# Altium footprint library PcbLib_jp.PcbLib: 178 footprints (part 8 of 12)
Each footprint in its own frame and in the unit in brackets; x right, y up, seen from the top. Pads: shape width x height; smd on the part's side, far side on the other; paste and mask are expansions set on the pad; w line width, h text height; cw(c..) or ccw(c..) is an arc to the next point about the centre after c.
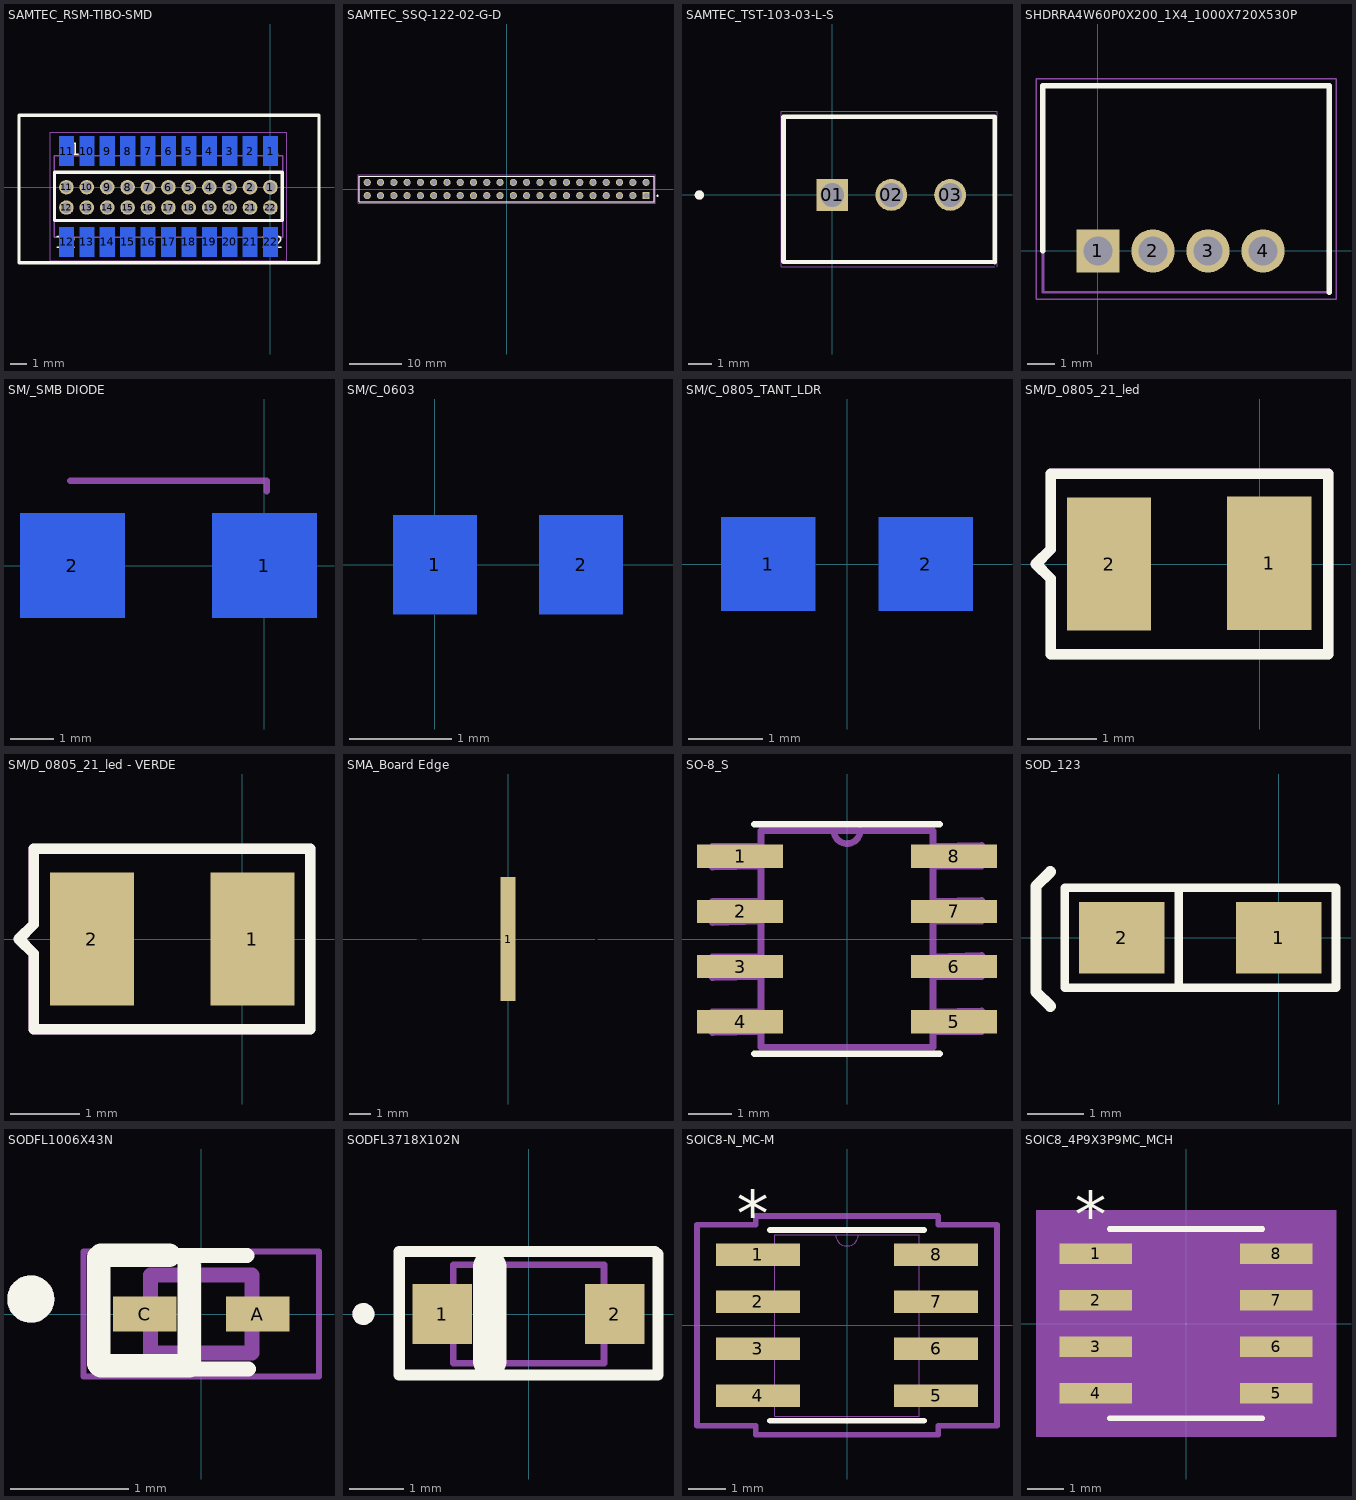
[diagram p7: the footprints below, top view; thin cyan lines are the x and y axes]

## SAMTEC_RSM-TIBO-SMD [mm]
pads (44):
  oval 0.914x0.889 hole 0.65: 1(0,0) 2(-1.27,0) 3(-2.54,0) 4(-3.81,0) 5(-5.08,0) 6(-6.35,0) 7(-7.62,0) 8(-8.89,0) 9(-10.16,0) 10(-11.43,0) 11(-12.7,0) 12(-12.7,-1.27) 13(-11.43,-1.27) 14(-10.16,-1.27) 15(-8.89,-1.27) 16(-7.62,-1.27) 17(-6.35,-1.27) 18(-5.08,-1.27) 19(-3.81,-1.27) 20(-2.54,-1.27) 21(-1.27,-1.27) 22(0,-1.27)
  rect 0.91x1.84 smd far side: 1(0.007,2.242) 2(-1.263,2.242) 3(-2.533,2.242) 4(-3.803,2.242) 5(-5.073,2.242) 6(-6.343,2.242) 7(-7.613,2.242) 8(-8.883,2.242) 9(-10.153,2.242) 10(-11.423,2.242) 11(-12.693,2.242) 12(-12.693,-3.408) 13(-11.423,-3.408) 14(-10.153,-3.408) 15(-8.883,-3.408) 16(-7.613,-3.408) 17(-6.343,-3.408) 18(-5.073,-3.408) 19(-3.803,-3.408) 20(-2.533,-3.408) 21(-1.263,-3.408) 22(0.007,-3.408)
Top Overlay:
  lines w0.2: -15.65,-4.7 3.025,-4.7 3.025,4.475 -15.65,4.475 -15.65,-4.475 -15.65,-4.7 ; -13.443,-2.075 -13.443,0.925 -13.155,0.925 0.732,0.925 0.732,-2.075 -13.106,-2.075 -13.443,-2.075
  text "1" at -0.075,1.975 h0.76
  text "11" at -13.175,1.975 h0.76
  text "12" at -13.425,-3.8 h0.76
  text "22" at -0.525,-3.8 h0.76
Mechanical 13:
  lines w0.1: -13.453,-3.123 0.767,-3.123 0.767,1.957 -13.453,1.957 -13.453,-3.123
Mechanical 15:
  lines w0.05: -13.703,-4.578 1.017,-4.578 1.017,3.412 -13.703,3.412 -13.703,-4.578
3D body "Tibbo Technology Inc-EM500.STEP": height 16.1, standoff -2.75, extent -15.45,-2.25 2.75,4.15

## SAMTEC_SSQ-122-02-G-D [mm]
pads (44):
  rect 1.37x1.37 hole 1.02: 01(26.67,-1.27)
  round 1.37 hole 1.02: 02(26.67,1.27) 03(24.13,-1.27) 04(24.13,1.27) 05(21.59,-1.27) 06(21.59,1.27) 07(19.05,-1.27) 08(19.05,1.27) 09(16.51,-1.27) 10(16.51,1.27) 11(13.97,-1.27) 12(13.97,1.27) 13(11.43,-1.27) 14(11.43,1.27) 15(8.89,-1.27) 16(8.89,1.27) 17(6.35,-1.27) 18(6.35,1.27) 19(3.81,-1.27) 20(3.81,1.27) 21(1.27,-1.27) 22(1.27,1.27) 23(-1.27,-1.27) 24(-1.27,1.27) 25(-3.81,-1.27) 26(-3.81,1.27) 27(-6.35,-1.27) 28(-6.35,1.27) 29(-8.89,-1.27) 30(-8.89,1.27) 31(-11.43,-1.27) 32(-11.43,1.27) 33(-13.97,-1.27) 34(-13.97,1.27) 35(-16.51,-1.27) 36(-16.51,1.27) 37(-19.05,-1.27) 38(-19.05,1.27) 39(-21.59,-1.27) 40(-21.59,1.27) 41(-24.13,-1.27) 42(-24.13,1.27) 43(-26.67,-1.27) 44(-26.67,1.27)
Top Overlay:
  circle w0.2: c28.845,-1.27 r0.1
  lines w0.2: -28.195,-2.475 -28.195,2.475 28.195,2.475 28.195,-2.475 -28.195,-2.475
Mechanical 13:
  circle w0.2: c28.845,-1.27 r0.1
  lines w0.1: -28.195,-2.475 -28.195,2.475 ; -28.195,-2.475 28.195,-2.475 ; -28.195,-2.475 -28.195,2.475 ; -28.195,2.475 28.195,2.475 ; -28.195,2.475 28.195,2.475 ; 28.195,-2.475 28.195,2.475 ; 28.195,-2.475 28.195,2.475
Mechanical 15:
  lines w0.05: -28.445,-2.725 -28.445,2.725 28.445,2.725 28.445,-2.725 -28.445,-2.725
3D body "76342322lf.stp": height 7, standoff -2.96, extent -28,-2.74 27.8,2.34

## SAMTEC_TST-103-03-L-S [mm]
pads (3):
  rect 1.37x1.37 hole 1.02: 01(0,0)
  round 1.37 hole 1.02: 02(2.54,0) 03(5.08,0)
Top Overlay:
  circle w0.2: c-5.73,0 r0.1
  lines w0.2: -2.1,3.356 -2.1,-2.874 7,-2.9 7,3.365 -2.1,3.365
Mechanical 13:
  circle w0.2: c-5.73,0 r0.1
  lines w0.1: -2.1,-2.874 7,-2.9 7,3.365 -2.1,3.365 ; -2.1,3.356 7,3.3
Mechanical 15:
  lines w0.05: 7,-3.1 -2.2,-3.1 -2.2,3.615 7.1,3.615 7.1,-3.1
3D body "588581_640456-3.stp": height 9.49, standoff -4.1, extent -1.31,-2.711 6.31,3.131

## SHDRRA4W60P0X200_1X4_1000X720X530P [mm]
pads (4):
  rect 1.575x1.575 hole 1.05: 1(0,0)
  round 1.575 hole 1.05: 2(2,0) 3(4,0) 4(6,0)
Top Overlay:
  lines w0.2: -2,0 -2,6 8.4,6 8.4,-1.5
Mechanical 13:
  lines w0.1: -2,-1.5 -2,6 8.4,6 8.4,-1.5 -2,-1.5
Mechanical 15:
  lines w0.05: -2.25,-1.75 8.65,-1.75 8.65,6.25 -2.25,6.25 -2.25,-1.75
3D body "DF3A-4P-2DS.stp": height 5.3, standoff -3.2, extent -1.84,-1.49 8.16,5.71

## SM/_SMB DIODE [mil]
pads (2):
  rect 96x96 smd far side: 1(0,0) 2(-176,0)
Bottom Overlay:
  lines w6: -125,75 -225,75 -225,-75 50,-75 ; -125,75 50,75 50,-75 ; -125,75 -125,-75 50,-75
Mechanical 2:
  lines w6: -178,78 2,78 2,68

## SM/C_0603 [mil]
height 137.8
pads (2):
  rect 32x38 smd far side: 1(0,0) 2(56,0)
Bottom Overlay:
  lines w6: -29.5,-32 -29.5,32.5 85.5,32.5 85.5,-32 -29.5,-32
3D body "CircuitWorks-RESISTOR 0603.STEP": height 3.15, standoff -16.93, extent -7.87,-16.92 55.12,16.93

## SM/C_0805_TANT_LDR [mil]
height 137.8
pads (2):
  rect 50x50 smd far side: 1(-42,0) 2(42,0)
Bottom Overlay:
  lines w6: -80,-37.5 80,-37.5 80,37.5 -80,37.5 -80,-37.5
  text "+" at -127,45 h56.25
3D body "User Library-Chip Cap_MLCC_0805 (2012)_B.STEP": height 23.62, standoff -7.87, extent -39.37,-25.59 39.37,23.62

## SM/D_0805_21_led [mil]
pads (2):
  rect 48x76 smd: 1(5.51,0.39) 2(-85.83,0)
Top Overlay:
  lines w6: -127.5,0 -119,8.5 -119,51.5 39,51.5 39,-51.5 -119,-51.5 -119,-8.5 -127.5,0
Mechanical 1:
  lines w6: -127.5,0 -119,8.5 -119,51.5 39,51.5 39,-51.5 -119,-51.5 -119,-8.5 -127.5,0
3D body "User Library-LED1206R.STEP": height 43.81, standoff -15.9, extent -103,-31 23,32

## SM/D_0805_21_led - VERDE [mil]
pads (2):
  rect 48x76 smd: 1(5.91,0) 2(-85.83,0)
Top Overlay:
  lines w6: -127.5,0 -119,-8.5 -119,-51.5 39,-51.5 39,51.5 -119,51.5 -119,8.5 -127.5,0
Mechanical 1:
  lines w6: -127.5,0 -119,-8.5 -119,-51.5 39,-51.5 39,51.5 -119,51.5 -119,8.5 -127.5,0
3D body "User Library-LED1206G.STEP": height 43.81, standoff -15.9, extent -102.37,-30.32 23.63,32.68

## SMA_Board Edge [mil]
pads (3):
  rect 27x225 smd: 1(0,0)
  rect 76x225 on Drill Drawing: 2(160,0) 3(-160,0)
3D body "User Library-142-0701-801.step": height 272, standoff -40, extent -187.49,-69.49 187.51,492.51

## SO-8_S [mil]
pads (8):
  rect 78x21 smd: 1(-97,75) 2(-97,25) 3(-97,-25) 4(-97,-75) 5(97,-75) 6(97,-25) 7(97,25) 8(97,75)
Top Overlay:
  lines w6: -84,-104 84,-104 ; -84,104 84,104
Mechanical 13:
  lines w6: -12,98.08 ccw(c0,98.5) 12,98.92 ; -122,-85 -78,-84 -78,-66 -122,-66 -122,-85 ; -122,-35 -78,-34 -78,-16 -122,-16 -122,-35 ; -122,15 -78,16 -78,34 -122,34 -122,15 ; -122,65 -78,66 -78,84 -122,84 -122,65 ; -78,-98 -78,98 -12,98 78,98 78,-98 -78,-98 ; 78,-84 122,-84 122,-65 78,-66 78,-84 ; 78,-34 122,-34 122,-15 78,-16 78,-34 ; 78,16 122,16 122,35 78,34 78,16 ; 78,66 122,66 122,85 78,84 78,66
3D body "CircuitWorks-SO-8.STEP": height 104.24, standoff 47.24, extent -121.62,-98.43 105.87,94.57

## SOD_123 [mil]
pads (2):
  rect 60x50 smd: 1(0,0) 2(-110,0)
Top Overlay:
  lines w1: -150,-35 25,-35 40,-35 40,35 -150,35 -150,-35
  lines w6: 40,-35 0,-35 -150,-35 -150,35 40,35 ; 40,-35 40,35 ; 40,-35 -70,-35 -70,35 -53,35 40,35 ; 40,-35 40,35
  lines w7.87: -160,-48 -170,-38 -170,36 -160,46
3D body "CircuitWorks-SOD123.STEP": height 50, standoff 0, extent -126.84,-31.5 18.83,31.5

## SODFL1006X43N [mm]
pads (2):
  rect 0.54x0.3 smd: A(0.48,0) C(-0.48,0)
Top Overlay:
  circle w0.2: c-1.446,0.127 r0.1
  lines w0.127: -0.41,0.495 0.39,0.495 ; -0.4,-0.465 0.4,-0.465
  lines w0.2: -0.87,0.48 -0.87,-0.42 -0.85,-0.44 -0.1,-0.44 -0.1,0.41 ; -0.85,0.5 -0.27,0.5
Mechanical 13:
  circle w0.2: c-1.446,0.127 r0.1
  lines w0.127: -0.43,-0.33 0.43,-0.33 0.43,0.33 -0.43,0.33 -0.43,-0.33
Mechanical 15:
  lines w0.05: -1,-0.53 1,-0.53 1,0.53 -1,0.53 -1,-0.53

## SODFL3718X102N [mm]
height 1.02
pads (2):
  rect 1.08x1.09 smd: 1(-1.575,0) 2(1.575,0)
Top Overlay:
  circle w0.2: c-3.015,0 r0.1
  lines w0.203: -2.362,-1.118 2.362,-1.118 2.362,1.092 2.311,1.143 -2.362,1.143 ; -2.362,-1.092 -2.362,1.118
  lines w0.61: -0.711,-0.864 -0.711,0.864
Mechanical 13:
  circle w0.2: c-3.015,0 r0.1
  lines w0.127: -1.375,-0.9 -1.375,0.9 1.375,0.9 1.375,-0.9 -1.375,-0.9
Mechanical 15:
  lines w0.05: -2.365,-1.15 -2.365,1.15 2.365,1.15 2.365,-1.15 -2.365,-1.15
3D body "User Library-SOD123W-1.STEP": height 1.1, standoff -0.01, extent -1.825,-0.95 1.875,0.95

## SOIC8-N_MC-M [mm]
pads (8):
  rect 2.27x0.608 smd paste+0 mask+0: 1(-2.412,1.905) 2(-2.412,0.635) 3(-2.412,-0.635) 4(-2.412,-1.905) 5(2.412,-1.905) 6(2.412,-0.635) 7(2.412,0.635) 8(2.412,1.905)
Top Overlay:
  lines w0.152: -2.083,-2.578 2.083,-2.578 ; -2.083,2.578 2.083,2.578
  text "*" at -2.984,2.386 h1.27
Mechanical 13:
  lines w0: -0.305,2.451 ccw(c0,2.451) 0.305,2.451
  lines w0.025: -2.997,-2.159 -2.997,-1.651 -1.956,-1.651 -1.956,-2.159 -2.997,-2.159 ; -2.997,-0.889 -2.997,-0.381 -1.956,-0.381 -1.956,-0.889 -2.997,-0.889 ; -2.997,0.381 -2.997,0.889 -1.956,0.889 -1.956,0.381 -2.997,0.381 ; -2.997,1.651 -2.997,2.159 -1.956,2.159 -1.956,1.651 -2.997,1.651 ; -1.956,-2.451 1.956,-2.451 1.956,2.451 -1.956,2.451 -1.956,-2.451 ; 1.956,-2.159 1.956,-1.651 2.997,-1.651 2.997,-2.159 1.956,-2.159 ; 1.956,-0.889 1.956,-0.381 2.997,-0.381 2.997,-0.889 1.956,-0.889 ; 1.956,0.381 1.956,0.889 2.997,0.889 2.997,0.381 1.956,0.381 ; 1.956,1.651 1.956,2.159 2.997,2.159 2.997,1.651 1.956,1.651
  text "*" at -1.892,1.105 h1.27
Mechanical 16:
  lines w0.152: -4.055,-2.717 -4.055,2.717 -2.464,2.717 -2.464,2.959 2.464,2.959 2.464,2.717 4.055,2.717 4.055,-2.717 2.464,-2.717 2.464,-2.959 -2.464,-2.959 -2.464,-2.717 -4.055,-2.717
3D body: height 0.25, standoff 0, extent 0,0 0.254,0.254
3D body "SOIC8-N_MC-M.step": height 1.76, standoff 0, extent -3.098,-2.451 2.896,2.451

## SOIC8_4P9X3P9MC_MCH [mil] "Authentication Chip 8-SOIC"
pads (8):
  rect 78x22 smd paste+0 mask+0: 1(-97,75) 2(-97,25) 3(-97,-25) 4(-97,-75) 5(97,-75) 6(97,-25) 7(97,25) 8(97,75)
Top Overlay:
  lines w6: -82,-101.5 82,-101.5 ; -82,101.5 82,101.5
  text "*" at -119.5,92 h50
Mechanical 5:
  region: 161,-121.5 -161,-121.5 -161,121.5 161,121.5
Mechanical 13:
  lines w0: -12,96.5 ccw(c0,96.5) 12,96.5
  lines w1: -122,-85 -122,-65 -77,-65 -77,-85 -122,-85 ; -122,-35 -122,-15 -77,-15 -77,-35 -122,-35 ; -122,15 -122,35 -77,35 -77,15 -122,15 ; -122,65 -122,85 -77,85 -77,65 -122,65 ; -77,-96.5 77,-96.5 77,96.5 -77,96.5 -77,-96.5 ; 77,-85 77,-65 122,-65 122,-85 77,-85 ; 77,-35 77,-15 122,-15 122,-35 77,-35 ; 77,15 77,35 122,35 122,15 77,15 ; 77,65 77,85 122,85 122,65 77,65
  text "*" at -74.5,43.5 h50
Mechanical 15:
  region: -87,-96 -146,-96 -146,96 -87,96 -87,106.5 87,106.5 87,96 146,96 146,-96 87,-96 87,-106.5 -87,-106.5
  lines w6: -146,-96 -146,96 -87,96 -87,106.5 87,106.5 87,96 146,96 146,-96 87,-96 87,-106.5 -87,-106.5 -87,-96 -146,-96
3D body "SOIC8_4P9X3P9MC_MCH.step": height 69.02, standoff 0, extent -125.15,-95.7 118.86,97.29
3D body "SOIC8_4P9X3P9MC_MCH.step": height 69.02, standoff 0, extent -122.01,-96.5 122.01,96.5